# Altium footprint library Cty1.PcbLib: 1378 footprints (part 28 of 87)
Each footprint in its own frame and in the unit in brackets; x right, y up, seen from the top. Pads: shape width x height; smd on the part's side, far side on the other; paste and mask are expansions set on the pad; w line width, h text height; cw(c..) or ccw(c..) is an arc to the next point about the centre after c.
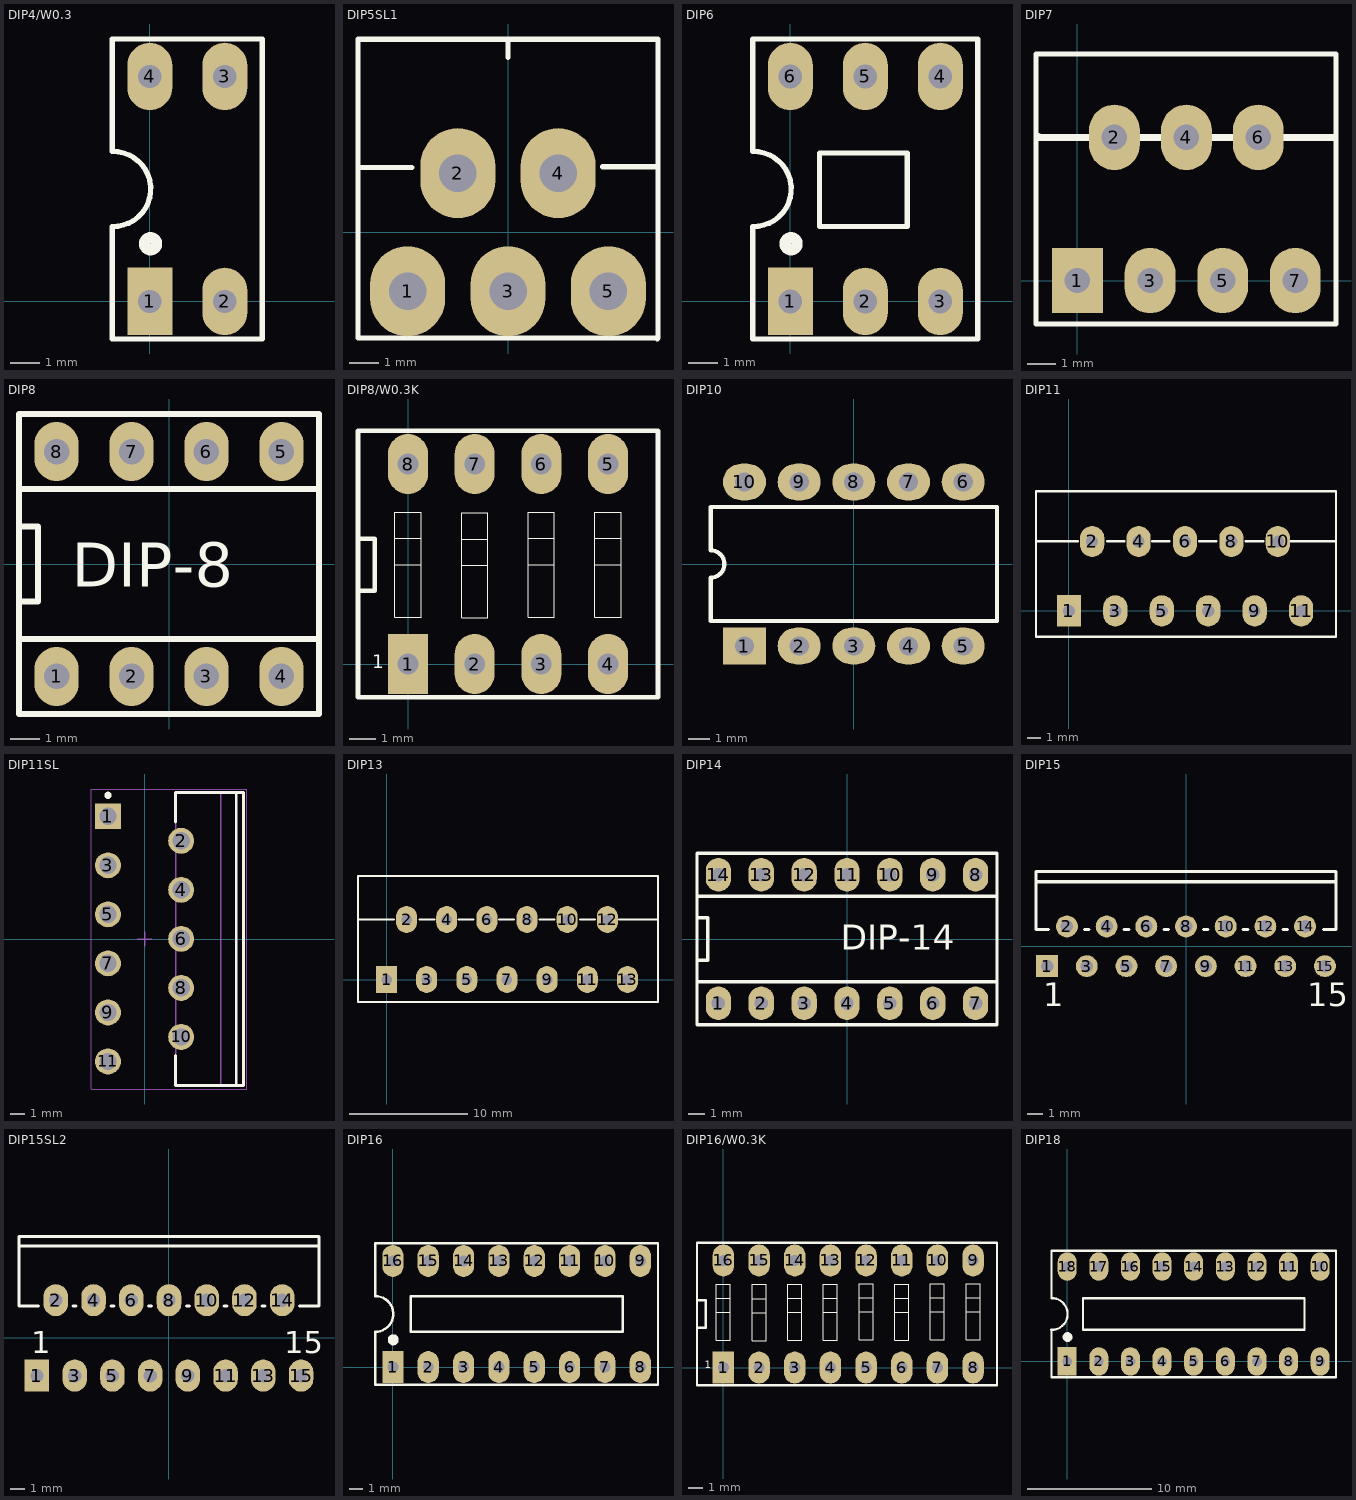
[diagram p27: the footprints below, top view; thin cyan lines are the x and y axes]

## DIP4/W0.3 [mil] "4 PIN, W 300mil, Pin to pin 100mil"
height 100
pads (4):
  rect 60x90 hole 31: 1(0,0)
  oval 60x90 hole 31: 2(100,0) 3(100,300) 4(0,300)
Top Overlay:
  circle w15: c1,77 r8
  lines w7: -50.38,100.05 ccw(c-48.69,150.02) -50,200 ; -50,100 -50,-50 150,-50 150,350 -50,350 -50,201
3D body "SW3DPS-DIP4-DEFAULT.STEP": height 169.69, standoff -129.13, extent -59.06,-10 159.06,304.96

## DIP5SL1 [mm]
pads (5):
  oval 2.54x3.048 hole 1.27: 1(-3.4,-2) 2(-1.7,2) 3(0,-2) 4(1.7,2) 5(3.4,-2)
Top Overlay:
  lines w0.178: -5.076,2.191 -3.248,2.191 ; 0,5.918 0,6.502 ; 3.204,2.216 5.033,2.216 ; -5.08,-3.581 -5.08,6.534 5.08,6.534 5.08,-3.581 5.055,-3.607 5.029,-3.581 -5.08,-3.581
3D body "TO220-5.STEP": height 18.81, standoff -9.47, extent -4.993,-2.246 5.207,6.31

## DIP6 [mil] "6 PIN, W 300mil, Pin to pin 100mil"
height 100
pads (6):
  rect 60x90 hole 31.5: 1(0,0)
  oval 60x90 hole 31.5: 2(100,0) 3(200,0) 4(200,300) 5(100,300) 6(0,300)
Top Overlay:
  circle w15: c1,77 r8
  lines w7: -50.38,100.05 ccw(c-48.69,150.02) -50,200 ; -50,100 -50,-50 250,-50 250,350 -50,350 -50,201 ; 39,100 156,100 156,198 39,198 39,100
3D body "SW3DPS-DIP6-DEFAULT.STEP": height 169.69, standoff -129.13, extent -58.11,-7.48 260,307.48

## DIP7 [mil]
pads (7):
  rect 70x90 hole 35: 1(0,0)
  oval 70x90 hole 35: 2(51,197) 3(100,0) 4(150,197) 5(200,0) 6(249,197) 7(300,0)
Top Overlay:
  lines w7: -57,-60 356,-60 356,312 -57,312 -57,-60
  lines w10: -54,198 -54,197 354,197
3D body "User Library-TO-220(T).STEP": height 756.77, standoff -77.87, extent -50.57,-11.02 351,311.02

## DIP8 [mm] "W.300/L.400"
pads (8):
  oval 1.5x2 hole 0.864: 1(-3.81,-3.81) 2(-1.27,-3.81) 3(1.27,-3.81) 4(3.81,-3.81) 5(3.81,3.81) 6(1.27,3.81) 7(-1.27,3.81) 8(-3.81,3.81)
Top Overlay:
  lines w0.203: -5.08,-2.54 -5.08,-1.27 ; -5.08,-2.54 -5.08,-5.08 5.08,-5.08 5.08,2.54 ; -5.08,-2.54 -5.08,2.54 ; -5.08,-2.54 5.08,-2.54 ; -5.08,-2.54 -5.08,2.54 ; -5.08,-2.54 5.08,-2.54 ; -5.08,-1.27 -5.08,1.27 ; -5.08,-1.27 -4.445,-1.27 ; -5.08,-1.27 -4.445,-1.27 ; -5.08,1.27 -5.08,5.08 5.08,5.08 5.08,2.54 ; -5.08,1.27 -4.445,1.27 ; -5.08,1.27 -4.445,1.27 ; -5.08,2.54 5.08,2.54 ; -5.08,2.54 5.08,2.54 ; -4.445,-1.27 -4.445,1.27 ; -4.445,-1.27 -4.445,1.27 ; 5.08,-2.54 5.08,2.54 ; 5.08,-2.54 5.08,2.54
  text "DIP-8" at -3.302,-0.762 h1.5
3D body "User Library-DIP8-300-metric.step": height 4.5, standoff -3.5, extent -5.4,-3.88 5.4,3.88

## DIP8/W0.3K [mil] "8 PIN, W 400mil , L 450mil, Pin to pin 100mil For Switch"
height 100
pads (8):
  rect 60x90 hole 31: 1(0,0)
  oval 60x90 hole 31: 2(100,0) 3(200,0) 4(300,0) 5(300,300) 6(200,300) 7(100,300) 8(0,300)
Top Overlay:
  lines w1.5: -19.68,149 19.68,149 ; -19.68,188.37 19.68,188.37 ; 80.31,148 119.69,148 ; 80.31,187.37 119.69,187.37 ; 180.31,149 219.69,149 ; 180.31,188.37 219.69,188.37 ; 280.31,149 319.69,149 ; 280.31,188.37 319.69,188.37 ; -19.68,70.26 -19.68,227.74 19.68,227.74 19.68,70.26 -19.68,70.26 ; 80.31,69.26 80.31,226.74 119.69,226.74 119.69,69.26 80.31,69.26 ; 180.31,70.26 180.31,227.74 219.69,227.74 219.69,70.26 180.31,70.26 ; 280.31,70.26 280.31,227.74 319.69,227.74 319.69,70.26 280.31,70.26
  lines w7: -75,68.5 -75,233 ; -75,110 -50,110 -50,188 -74,188 -75,189 ; -75,126 -75,-50 375,-50 375,350 -75,350 -75,176
  text "1" at -54,-6 h20
3D body "switch 4bank x1.STEP": height 158.27, standoff -9.84, extent -80,-45.08 377.87,345.08

## DIP10 [mm] "DIP; 10 Leads; Row Spacing 7.62 mm; Pitch 2.54 mm"
height 4.42
pads (10):
  rect 2x1.7 hole 0.9: 1(-5.08,-3.81)
  oval 2x1.7 hole 0.9: 2(-2.54,-3.81) 3(0,-3.81) 4(2.54,-3.81) 5(5.08,-3.81) 6(5.08,3.81) 7(2.54,3.81) 8(0,3.81) 9(-2.54,3.81) 10(-5.08,3.81)
Top Overlay:
  lines w0.2: -6.65,-2.65 6.65,-2.65 6.65,2.65 -6.65,2.65 -6.65,0.635 cw(c-6.65,0) -6.65,-0.635 -6.65,-2.65

## DIP11 [mil] "11 Pin so le hai hang cach nhau 200mil., Pin to pin 100mil"
pads (11):
  rect 70x90 hole 35: 1(0,0)
  oval 70x90 hole 35: 2(66.93,200) 3(133.86,0) 4(200.79,200) 5(267.72,0) 6(334.65,200) 7(401.57,0) 8(468.5,200) 9(535.43,0) 10(602.36,200) 11(669.29,0)
Top Overlay:
  lines w7: -95,200 25,200 ; 110,200 160,200 ; 240,200 290,200 ; 375,200 425,200 ; 510,200 560,200 ; 630,200 770,200 ; -95,-75 -95,345 770,345 770,-75 -95,-75

## DIP11SL [mm] "FM, 11-Leads, Body 20.015x4.495mm, Pitch 1.7mm"
height 20.82
pads (11):
  rect 1.8x1.8 hole 1.2: 1(-2.54,8.51)
  round 1.8 hole 1.2: 2(2.54,6.81) 3(-2.54,5.11) 4(2.54,3.41) 5(-2.54,1.71) 6(2.54,0.01) 7(-2.54,-1.69) 8(2.54,-3.39) 9(-2.54,-5.09) 10(2.54,-6.79) 11(-2.54,-8.49)
Top Overlay:
  circle w0.25: c-2.54,9.96 r0.125
  lines w0.2: 2.155,-8.09 2.155,-10.15 6.855,-10.15 6.855,10.15 2.155,10.15 2.155,8.11 ; 6.355,-10.15 6.355,10.15
Mechanical 13:
  lines w0.1: 5.28,-10.15 5.28,10.15 ; 2.18,-10.15 6.83,-10.15 6.83,10.15 2.18,10.15 2.18,-10.15
Mechanical 15:
  lines w0.05: -3.69,-10.4 7.08,-10.4 7.08,10.4 -3.69,10.4 -3.69,-10.4
  lines w0.1: -0.5,0 0.5,0 ; 0,-0.5 0,0.5
3D body: height 20.82, standoff 19.92, extent 5.28,-10 6.83,10
3D body: height 18.4, standoff 18.02, extent 5.28,-10 6.83,-1.9
3D body: height 18.4, standoff 18.02, extent 5.28,1.9 6.83,10
3D body: height 18.02, standoff 17.65, extent 5.28,-10 6.83,-1.9
3D body: height 18.02, standoff 17.65, extent 5.28,1.9 6.83,10
3D body: height 18.75, standoff 18.39, extent 5.28,-10 6.83,-1.863
3D body: height 18.75, standoff 18.39, extent 5.28,1.863 6.83,10
3D body: height 17.65, standoff 17.29, extent 5.28,-10 6.83,-1.863
3D body: height 17.65, standoff 17.29, extent 5.28,1.863 6.83,10
3D body: height 19.08, standoff 18.75, extent 5.28,-10 6.83,-1.755
3D body: height 19.08, standoff 18.75, extent 5.28,1.755 6.83,10
3D body: height 17.3, standoff 16.96, extent 5.28,-10 6.83,-1.755
3D body: height 17.3, standoff 16.96, extent 5.28,1.755 6.83,10
3D body: height 19.37, standoff 19.08, extent 5.28,-10 6.83,-1.58
3D body: height 19.37, standoff 19.08, extent 5.28,1.58 6.83,10
3D body: height 16.97, standoff 16.68, extent 5.28,-10 6.83,-1.58
3D body: height 16.97, standoff 16.68, extent 5.28,1.58 6.83,10
3D body: height 19.6, standoff 19.36, extent 5.28,-10 6.83,-1.344
3D body: height 19.6, standoff 19.36, extent 5.28,1.344 6.83,10
3D body: height 16.68, standoff 16.44, extent 5.28,-10 6.83,-1.344
3D body: height 16.68, standoff 16.44, extent 5.28,1.344 6.83,10
3D body: height 19.78, standoff 19.6, extent 5.28,-10 6.83,-1.056
3D body: height 19.78, standoff 19.6, extent 5.28,1.056 6.83,10
3D body: height 16.45, standoff 16.26, extent 5.28,-10 6.83,-1.056
3D body: height 16.45, standoff 16.26, extent 5.28,1.056 6.83,10
3D body: height 19.89, standoff 19.78, extent 5.28,-10 6.83,-0.727
3D body: height 19.89, standoff 19.78, extent 5.28,0.727 6.83,10
3D body: height 16.27, standoff 16.16, extent 5.28,-10 6.83,-0.727
3D body: height 16.27, standoff 16.16, extent 5.28,0.727 6.83,10
3D body: height 19.92, standoff 19.88, extent 5.28,-10 6.83,-0.371
3D body: height 19.92, standoff 19.88, extent 5.28,0.371 6.83,10
3D body: height 16.16, standoff 16.12, extent 5.28,-10 6.83,-0.371
3D body: height 16.16, standoff 16.12, extent 5.28,0.371 6.83,10
3D body: height 16.12, standoff 14.47, extent 5.28,-10 6.83,10
3D body: height 14.47, standoff 2.69, extent 2.18,-10.15 6.83,10.15
3D body: height 0, standoff -1.6, extent -2.785,-8.975 -2.295,-8.005
3D body: height 2.69, standoff 1.59, extent 4.26,-9.14 4.75,-7.84
3D body: height 1.59, standoff 1.1, extent -2.785,-9.14 4.75,-7.84
3D body: height 1.1, standoff 0, extent -2.785,-9.14 -2.295,-7.84
3D body: height 0, standoff -1.6, extent 2.295,-7.275 2.785,-6.305
3D body: height 2.69, standoff 1.59, extent 4.26,-7.44 4.75,-6.14
3D body: height 1.59, standoff 1.1, extent 2.295,-7.44 4.75,-6.14
3D body: height 1.1, standoff 0, extent 2.295,-7.44 2.785,-6.14
3D body: height 0, standoff -1.6, extent -2.785,-5.575 -2.295,-4.605
3D body: height 2.69, standoff 1.59, extent 4.26,-5.74 4.75,-4.44
3D body: height 1.59, standoff 1.1, extent -2.785,-5.74 4.75,-4.44
3D body: height 1.1, standoff 0, extent -2.785,-5.74 -2.295,-4.44
3D body: height 0, standoff -1.6, extent 2.295,-3.875 2.785,-2.905
3D body: height 2.69, standoff 1.59, extent 4.26,-4.04 4.75,-2.74
3D body: height 1.59, standoff 1.1, extent 2.295,-4.04 4.75,-2.74
3D body: height 1.1, standoff 0, extent 2.295,-4.04 2.785,-2.74
3D body: height 0, standoff -1.6, extent -2.785,-2.175 -2.295,-1.205
3D body: height 2.69, standoff 1.59, extent 4.26,-2.34 4.75,-1.04
3D body: height 1.59, standoff 1.1, extent -2.785,-2.34 4.75,-1.04
3D body: height 1.1, standoff 0, extent -2.785,-2.34 -2.295,-1.04
3D body: height 0, standoff -1.6, extent 2.295,-0.475 2.785,0.495
3D body: height 2.69, standoff 1.59, extent 4.26,-0.64 4.75,0.66
3D body: height 1.59, standoff 1.1, extent 2.295,-0.64 4.75,0.66
3D body: height 1.1, standoff 0, extent 2.295,-0.64 2.785,0.66
3D body: height 0, standoff -1.6, extent -2.785,1.225 -2.295,2.195
3D body: height 2.69, standoff 1.59, extent 4.26,1.06 4.75,2.36
3D body: height 1.59, standoff 1.1, extent -2.785,1.06 4.75,2.36
3D body: height 1.1, standoff 0, extent -2.785,1.06 -2.295,2.36
3D body: height 0, standoff -1.6, extent 2.295,2.925 2.785,3.895
3D body: height 2.69, standoff 1.59, extent 4.26,2.76 4.75,4.06
3D body: height 1.59, standoff 1.1, extent 2.295,2.76 4.75,4.06
3D body: height 1.1, standoff 0, extent 2.295,2.76 2.785,4.06
3D body: height 0, standoff -1.6, extent -2.785,4.625 -2.295,5.595
3D body: height 2.69, standoff 1.59, extent 4.26,4.46 4.75,5.76
3D body: height 1.59, standoff 1.1, extent -2.785,4.46 4.75,5.76
3D body: height 1.1, standoff 0, extent -2.785,4.46 -2.295,5.76
3D body: height 0, standoff -1.6, extent 2.295,6.325 2.785,7.295
3D body: height 2.69, standoff 1.59, extent 4.26,6.16 4.75,7.46
3D body: height 1.59, standoff 1.1, extent 2.295,6.16 4.75,7.46
3D body: height 1.1, standoff 0, extent 2.295,6.16 2.785,7.46
3D body: height 0, standoff -1.6, extent -2.785,8.025 -2.295,8.995
3D body: height 2.69, standoff 1.59, extent 4.26,7.86 4.75,9.16
3D body: height 1.59, standoff 1.1, extent -2.785,7.86 4.75,9.16
3D body: height 1.1, standoff 0, extent -2.785,7.86 -2.295,9.16

## DIP13 [mil] "13 Pin so le hai hang cach nhau 200mil., Pin to pin 100mil"
pads (13):
  rect 70x90 hole 35: 1(0,0)
  oval 70x90 hole 35: 2(66.93,200) 3(133.86,0) 4(200.79,200) 5(267.72,0) 6(334.65,200) 7(401.57,0) 8(468.5,200) 9(535.43,0) 10(602.36,200) 11(669.29,0) 12(736.22,200) 13(803.15,0)
Top Overlay:
  lines w7: -95,200 25,200 ; 110,200 160,200 ; 240,200 290,200 ; 375,200 425,200 ; 510,200 560,200 ; 645,200 695,200 ; 775,200 905,200 ; -95,-75 905,-75 905,345 -95,345 -95,-75
3D body "User Library-SOT141-6.STEP": height 800.63, standoff -197.02, extent -71.84,-80.53 873.04,380.91

## DIP14 [mm] "W.300/L.900"
height 5.59
pads (14):
  oval 1.5x2 hole 0.8: 1(-7.62,-3.81) 2(-5.08,-3.81) 3(-2.54,-3.81) 4(0,-3.81) 5(2.54,-3.81) 6(5.08,-3.81) 7(7.62,-3.81) 8(7.62,3.81) 9(5.08,3.81) 10(2.54,3.81) 11(0,3.81) 12(-2.54,3.81) 13(-5.08,3.81) 14(-7.62,3.81)
Top Overlay:
  lines w0.203: -8.89,-2.54 -8.89,-1.27 ; -8.89,-2.54 -8.89,-1.27 ; -8.89,-2.54 8.89,-2.54 ; -8.89,-2.54 8.89,-2.54 ; -8.89,-1.27 -8.255,-1.27 ; -8.89,-1.27 -8.89,1.27 ; -8.89,-1.27 -8.255,-1.27 ; -8.89,-1.27 -8.89,1.27 ; -8.89,1.27 -8.255,1.27 ; -8.89,1.27 -8.89,2.54 ; -8.89,1.27 -8.255,1.27 ; -8.89,1.27 -8.89,2.54 ; -8.89,2.54 8.89,2.54 ; -8.89,2.54 8.89,2.54 ; -8.255,-1.27 -8.255,1.27 ; -8.255,-1.27 -8.255,1.27 ; 8.89,-2.54 8.89,2.54 ; -8.89,-5.08 8.89,-5.08 8.89,5.08 -8.89,5.08 -8.89,-5.08
  text "DIP-14" at -0.381,-0.635 h1.5
3D body "User Library-DIP14-300-metric.step": height 4.5, standoff -3.5, extent -9.05,-3.88 9.05,3.88

## DIP15 [mm] "TO, Thru-Hole, Vertical, Heatsink Mounted; 15 Bent Staggered Leads; Pitch 1.27 mm"
height 17.3
pads (15):
  rect 1.4x1.4 hole 0.8: 1(-8.89,-1.27)
  round 1.4 hole 0.8: 2(-7.62,1.27) 3(-6.35,-1.27) 4(-5.08,1.27) 5(-3.81,-1.27) 6(-2.54,1.27) 7(-1.27,-1.27) 8(0,1.27) 9(1.27,-1.27) 10(2.54,1.27) 11(3.81,-1.27) 12(5.08,1.27) 13(6.35,-1.27) 14(7.62,1.27) 15(8.89,-1.27)
Top Overlay:
  lines w0.2: -9.6,4.13 9.6,4.13 ; -8.8,1.08 -9.6,1.08 -9.6,4.78 9.6,4.78 9.6,1.08 8.8,1.08 ; -6.5,1.08 -6.2,1.08 ; -3.96,1.08 -3.66,1.08 ; -1.42,1.08 -1.12,1.08 ; 1.12,1.08 1.42,1.08 ; 3.66,1.08 3.96,1.08 ; 6.2,1.08 6.5,1.08
  text "1" at -9.14,-3.845 h1.5
  text "15" at 7.765,-3.845 h1.5
3D body "User Library-MULTIWAT T15.step": height 22.74, standoff -2.18, extent -9.8,-1.778 9.8,7.29

## DIP15SL2 [mil] "TO, Thru-Hole, Vertical, Heatsink Mounted; 15 Bent Staggered Leads; Pitch 1.27 mm"
height 826.77
pads (15):
  rect 65x85 hole 35.43: 1(-350,-100)
  oval 65x85 hole 35.43: 2(-300,100) 3(-250,-100) 4(-200,100) 5(-150,-100) 6(-100,100) 7(-50,-100) 8(0,100) 9(50,-100) 10(100,100) 11(150,-100) 12(200,100) 13(250,-100) 14(300,100) 15(350,-100)
Top Overlay:
  lines w7.87: -397.64,243.7 397.64,243.7 ; -346.46,84.25 -397.64,84.25 -397.64,269.29 397.64,269.29 397.64,84.25 346.46,84.25 ; -253.94,84.25 -246.06,84.25 ; -153.94,84.25 -146.06,84.25 ; -53.94,84.25 -46.06,84.25 ; 46.06,84.25 53.94,84.25 ; 146.06,84.25 153.94,84.25 ; 246.06,84.25 253.94,84.25
  text "15" at 305,-40 h59.06
  text "1" at -365,-40 h59.06
3D body "User Library-MULTIWAT T15.step": height 895.25, standoff -85.66, extent -381.82,-109.82 389.84,247.19

## DIP16 [mil] "16 PIN, W 300mil, Pin to pin 100mil"
height 100
pads (16):
  rect 60x90 hole 31: 1(0,0)
  oval 60x90 hole 31: 2(100,0) 3(200,0) 4(300,0) 5(400,0) 6(500,0) 7(600,0) 8(700,0) 9(700,300) 10(600,300) 11(500,300) 12(400,300) 13(300,300) 14(200,300) 15(100,300) 16(0,300)
Top Overlay:
  circle w15: c1,77 r8
  lines w7: -50.38,100.05 ccw(c-48.69,150.02) -50,200 ; -50,100 -50,-50 750,-50 750,350 -49,350 -50,349 ; -50,201 -50,350 ; 50,100 650,100 650,200 50,200 50,100
3D body "SW3dPS-DIP 16 _ socket 214.STEP": height 299.42, standoff -131.12, extent -51.7,-57.39 751.7,356

## DIP16/W0.3K [mil] "16 PIN, W 300mil, Pin to pin 100mil For Switch"
height 100
pads (16):
  rect 60x90 hole 31.5: 1(0,0)
  oval 60x90 hole 31.5: 2(100,0) 3(200,0) 4(300,0) 5(400,0) 6(500,0) 7(600,0) 8(700,0) 9(700,300) 10(600,300) 11(500,300) 12(400,300) 13(300,300) 14(200,300) 15(100,300) 16(0,300)
Top Overlay:
  lines w1.5: -19.68,155 19.68,155 ; -19.68,194.37 19.68,194.37 ; 80.31,154 119.69,154 ; 80.31,193.37 119.69,193.37 ; 180.31,155 219.69,155 ; 180.31,194.37 219.69,194.37 ; 280.31,155 319.69,155 ; 280.31,194.37 319.69,194.37 ; 380.31,156 419.69,156 ; 380.31,195.37 419.69,195.37 ; 480.31,155 519.68,155 ; 480.31,194.37 519.68,194.37 ; 580.32,156 619.68,156 ; 580.32,195.37 619.68,195.37 ; 680.32,156 719.68,156 ; 680.32,195.37 719.68,195.37 ; -19.68,76.26 -19.68,233.74 19.68,233.74 19.68,76.26 -19.68,76.26 ; 80.31,75.26 80.31,232.74 119.69,232.74 119.69,75.26 80.31,75.26 ; 180.31,76.26 180.31,233.74 219.69,233.74 219.69,76.26 180.31,76.26 ; 280.31,76.26 280.31,233.74 319.69,233.74 319.69,76.26 280.31,76.26 ; 380.31,77.26 380.31,234.74 419.69,234.74 419.69,77.26 380.31,77.26 ; 480.31,76.26 480.31,233.74 519.68,233.74 519.68,76.26 480.31,76.26 ; 580.32,77.26 580.32,234.74 619.68,234.74 619.68,77.26 580.32,77.26 ; 680.32,77.26 680.32,234.74 719.68,234.74 719.68,77.26 680.32,77.26
  lines w7: -74,69.5 -74,234 ; -74,111 -49,111 -49,189 -73,189 -74,190 ; -74,125 -74,-49 -73,-50 767,-50 767,350 -74,350 -74,175
  text "1" at -52,-2 h20
3D body "SW3dPS-DIP SWITCH 8 POS CTS 206.STEP": height 324.8, standoff -137.8, extent -92.91,-40 792.91,345.04

## DIP18 [mil] "18 PIN, W 300mil, Pin to pin 100mil"
height 100
pads (18):
  rect 60x90 hole 31: 1(0,0)
  oval 60x90 hole 31: 2(100,0) 3(200,0) 4(300,0) 5(400,0) 6(500,0) 7(600,0) 8(700,0) 9(800,0) 10(800,300) 11(700,300) 12(600,300) 13(500,300) 14(400,300) 15(300,300) 16(200,300) 17(100,300) 18(0,300)
Top Overlay:
  circle w15: c1,77 r8
  lines w7: -50.38,100.05 ccw(c-48.69,150.02) -50,200 ; -50,100 -50,-50 850,-50 850,350 -50,350 -50,201 ; 50,100 50,200 750,200 750,100 50,100
3D body "SW3dPS-DIP18.STEP": height 118.71, standoff -131.12, extent -51.18,-57.39 849.18,356